# Altium footprint library Connectors THD.PcbLib: 631 footprints (part 38 of 46) (continued)
## SOURIAU_UT071619P21E8T [mm] "Metal Circular Connector, 19 Male Contacts, Shell Size 16, UT07 Series" (continued)
  text "19" at -7.866,5.19 h1.2
  text "5" at -5.429,-1.946 h1.2
  text "15" at -7.797,-6.635 h1.2
  text "10" at 5.554,5.891 h1.2
  text "1" at 0.522,2.079 h1.2
  text "B19M" at -1.964,13.841 h1.2
3D body: height 31.35, standoff -4.75, extent -19.05,-19.05 19.05,19.05

## SOURIAU_UT071619S21E84T [mm] "Metal Circular Connector, 19 Female Contacts, Shell Size 16, UT07 Series"
height 24.3
pads (19):
  round 1.9 hole 1.2: 1(0,0) 2(-2.75,2.8) 3(-3.8,-1) 4(-1,-3.8) 5(2.75,-2.8) 6(3.8,1) 7(1,3.8) 8(0,7.5) 9(-3.75,6.5) 10(-6.5,3.75) 11(-7.5,0) 12(-6.5,-3.75) 13(-3.75,-6.5) 14(0,-7.5) 15(3.75,-6.5) 16(6.5,-3.75) 17(7.5,0) 18(6.5,3.75) 19(3.75,6.5)
Top Overlay:
  circle w0.2: c0,0 r1.65
  circle w0.2: c2.75,-2.8 r1.65
  circle w0.2: c-6.5,3.75 r1.65
  circle w0.2: c3.75,-6.5 r1.65
  circle w0.2: c0,0 r12.65
  circle w0.2: c0,0 r16
  circle w0.2: c0,0 r18
  circle w0.2: c3.75,6.5 r1.65
  lines w0.2: -11.505,7.739 cw(c0,0) -4.585,13.085 4.585,13.085 cw(c0,0) 11.504,7.74 ; -11.397,5.489 -13.16,6.507 -12.215,8.143 -10.452,7.126 ; -7.077,-1.595 -6.927,-2.156 ; -7.077,1.595 -6.927,2.156 ; -5.333,-4.917 -4.917,-5.333 ; -5.333,4.917 -4.917,5.333 ; -3.361,0.59 -3.189,1.21 ; -2.633,-2.167 -2.167,-2.633 ; -2.156,-6.927 -1.609,-7.073 ; -2.156,6.925 -1.594,7.075 ; -1.594,1.623 -1.156,1.177 ; -0.945,-12.615 -0.945,-14.65 0.945,-14.65 0.945,-12.615 ; 0.43,5.907 0.57,5.393 ; 0.594,-3.375 1.156,-3.225 ; 0.952,-13.832 ccw(c0,0) 12.452,6.098 ; 1.58,-7.081 2.156,-6.927 ; 2.167,2.633 2.633,2.167 ; 3.189,-1.21 3.361,-0.59 ; 4.917,-5.333 5.333,-4.917 ; 4.917,5.333 5.333,4.917 ; 6.927,-2.156 7.077,-1.594 ; 6.927,2.156 7.077,1.594 ; 10.452,7.126 12.215,8.143 13.16,6.507 11.397,5.489 ; -19.05,-7.97 ccw(c0,0) -7.97,-19.05 7.97,-19.05 ccw(c0,0) 19.05,-7.97 19.05,7.97 ccw(c0,0) 7.97,19.05 -7.97,19.05 ccw(c0,0) -19.05,7.97 -19.05,-7.97 ; -16,-7.089 ccw(c0,0) -14.139,-10.312 -1.861,-17.401 ccw(c0,0) 1.861,-17.401 14.139,-10.312 ccw(c0,0) 16,-7.089 16,7.089 ccw(c0,0) 14.139,10.312 1.861,17.401 ccw(c0,0) -1.861,17.401 -14.139,10.312 ccw(c0,0) -16,7.089 -16,-7.089 ; -12.456,6.09 ccw(c0,0) -0.947,-13.833 cw(c0,0) -12.456,6.09 ; -11.442,-2.445 ccw(c0,0) -11.131,-3.604 -10.115,-3.332 ccw(c0,0) -7.294,-7.76 -7.97,-8.565 ccw(c0,0) -7.051,-9.337 -6.375,-8.531 ccw(c0,0) 5.607,-9.054 6.211,-9.916 ccw(c0,0) 7.194,-9.227 6.59,-8.366 ccw(c0,0) 10.54,-1.524 11.588,-1.616 ccw(c0,0) 11.692,-0.421 10.645,-0.329 ccw(c0,0) 1.4,10.558 1.4,11.616 ccw(c0,0) -1.4,11.616 -1.4,10.558 ccw(c0,0) -10.426,-2.172 -11.442,-2.445
  text "B19F" at -1.887,13.856 h1.2
  text "B19F" at -1.887,13.856 h1.2
  text "1" at -0.9,2.075 h1.2
  text "10" at -7.4,5.8 h1.2
  text "15" at 5.8,-6.75 h1.2
  text "5" at 4.625,-1.9 h1.2
  text "19" at 5.875,5.375 h1.2
Mechanical 8:
  circle w0.1: c1,3.8 r1.2
  circle w0.1: c-2.75,2.8 r1.2
  circle w0.1: c-3.8,-1 r1.2
  circle w0.1: c-1,-3.8 r1.2
  circle w0.1: c3.8,1 r1.2
  circle w0.1: c6.5,3.75 r1.2
  circle w0.1: c7.5,0 r1.2
  circle w0.1: c6.5,-3.75 r1.2
  circle w0.1: c0,-7.5 r1.2
  circle w0.1: c-3.75,-6.5 r1.2
  circle w0.1: c-6.5,-3.75 r1.2
  circle w0.1: c-7.5,0 r1.2
  circle w0.1: c-3.75,6.5 r1.2
  circle w0.1: c0,7.5 r1.2
  circle w0.1: c-6.5,3.75 r1.2
  circle w0.1: c3.75,6.5 r1.2
  circle w0.1: c3.75,-6.5 r1.2
  circle w0.1: c2.75,-2.8 r1.2
  circle w0.1: c0,0 r1.2
  lines w0.1: -8,0 -7.5,0 ; -7.5,-0.5 -7.5,0 ; -7.5,0.5 -7.5,0 ; -7,-3.75 -6.5,-3.75 ; -7,0 -7.5,0 ; -7,3.75 -6.5,3.75 ; -6.5,-4.25 -6.5,-3.75 ; -6.5,-3.25 -6.5,-3.75 ; -6.5,3.25 -6.5,3.75 ; -6.5,4.25 -6.5,3.75 ; -6,-3.75 -6.5,-3.75 ; -6,3.75 -6.5,3.75 ; -4.3,-1 -3.8,-1 ; -4.25,-6.5 -3.75,-6.5 ; -4.25,6.5 -3.75,6.5 ; -3.8,-1.5 -3.8,-1 ; -3.8,-0.5 -3.8,-1 ; -3.75,-7 -3.75,-6.5 ; -3.75,-6 -3.75,-6.5 ; -3.75,6 -3.75,6.5 ; -3.75,7 -3.75,6.5 ; -3.3,-1 -3.8,-1 ; -3.25,-6.5 -3.75,-6.5 ; -3.25,2.8 -2.75,2.8 ; -3.25,6.5 -3.75,6.5 ; -2.75,2.3 -2.75,2.8 ; -2.75,3.3 -2.75,2.8 ; -2.25,2.8 -2.75,2.8 ; -1.5,-3.8 -1,-3.8 ; -1,-4.3 -1,-3.8 ; -1,-3.3 -1,-3.8 ; -0.5,-7.5 0,-7.5 ; -0.5,-3.8 -1,-3.8 ; -0.5,0 0,0 ; -0.5,7.5 0,7.5 ; 0,-8 0,-7.5 ; 0,-7 0,-7.5 ; 0,-0.5 0,0 ; 0,0.5 0,0 ; 0,7 0,7.5 ; 0,8 0,7.5 ; 0.5,-7.5 0,-7.5 ; 0.5,0 0,0 ; 0.5,3.8 1,3.8 ; 0.5,7.5 0,7.5 ; 1,3.3 1,3.8 ; 1,4.3 1,3.8 ; 1.5,3.8 1,3.8 ; 2.25,-2.8 2.75,-2.8 ; 2.75,-3.3 2.75,-2.8 ; 2.75,-2.3 2.75,-2.8 ; 3.25,-6.5 3.75,-6.5 ; 3.25,-2.8 2.75,-2.8 ; 3.25,6.5 3.75,6.5 ; 3.3,1 3.8,1 ; 3.75,-7 3.75,-6.5 ; 3.75,-6 3.75,-6.5 ; 3.75,6 3.75,6.5 ; 3.75,7 3.75,6.5 ; 3.8,0.5 3.8,1 ; 3.8,1.5 3.8,1 ; 4.25,-6.5 3.75,-6.5 ; 4.25,6.5 3.75,6.5 ; 4.3,1 3.8,1 ; 6,-3.75 6.5,-3.75 ; 6,3.75 6.5,3.75 ; 6.5,-4.25 6.5,-3.75 ; 6.5,-3.25 6.5,-3.75 ; 6.5,3.25 6.5,3.75 ; 6.5,4.25 6.5,3.75 ; 7,-3.75 6.5,-3.75 ; 7,0 7.5,0 ; 7,3.75 6.5,3.75 ; 7.5,-0.5 7.5,0 ; 7.5,0.5 7.5,0 ; 8,0 7.5,0
Mechanical 14:
  circle w0.1: c3.75,6.5 r1.65
  circle w0.1: c0,0 r18
  circle w0.1: c0,0 r16
  circle w0.1: c0,0 r12.65
  circle w0.1: c3.75,-6.5 r1.65
  circle w0.1: c-6.5,3.75 r1.65
  circle w0.1: c2.75,-2.8 r1.65
  circle w0.1: c0,0 r1.65
  lines w0.1: -12.456,6.09 ccw(c0,0) -0.947,-13.833 ; -11.505,7.739 cw(c0,0) -4.585,13.085 4.585,13.085 cw(c0,0) 11.504,7.74 ; -11.397,5.489 -13.16,6.507 -12.215,8.143 -10.452,7.126 ; -7.077,-1.595 -6.927,-2.156 ; -7.077,1.595 -6.927,2.156 ; -5.333,-4.917 -4.917,-5.333 ; -5.333,4.917 -4.917,5.333 ; -3.361,0.59 -3.189,1.21 ; -2.633,-2.167 -2.167,-2.633 ; -2.156,-6.927 -1.609,-7.073 ; -2.156,6.925 -1.594,7.075 ; -1.594,1.623 -1.156,1.177 ; -0.945,-12.615 -0.945,-14.65 0.945,-14.65 0.945,-12.615 ; 0.43,5.907 0.57,5.393 ; 0.594,-3.375 1.156,-3.225 ; 0.952,-13.832 ccw(c0,0) 12.452,6.098 ; 1.58,-7.081 2.156,-6.927 ; 2.167,2.633 2.633,2.167 ; 3.189,-1.21 3.361,-0.59 ; 4.917,-5.333 5.333,-4.917 ; 4.917,5.333 5.333,4.917 ; 6.927,-2.156 7.077,-1.594 ; 6.927,2.156 7.077,1.594 ; 10.452,7.126 12.215,8.143 13.16,6.507 11.397,5.489 ; -19.05,-7.97 ccw(c0,0) -7.97,-19.05 7.97,-19.05 ccw(c0,0) 19.05,-7.97 19.05,7.97 ccw(c0,0) 7.97,19.05 -7.97,19.05 ccw(c0,0) -19.05,7.97 -19.05,-7.97 ; -16,-7.089 ccw(c0,0) -14.139,-10.312 -1.861,-17.401 ccw(c0,0) 1.861,-17.401 14.139,-10.312 ccw(c0,0) 16,-7.089 16,7.089 ccw(c0,0) 14.139,10.312 1.861,17.401 ccw(c0,0) -1.861,17.401 -14.139,10.312 ccw(c0,0) -16,7.089 -16,-7.089 ; -11.442,-2.445 ccw(c0,0) -11.131,-3.604 -10.115,-3.332 ccw(c0,0) -7.294,-7.76 -7.97,-8.565 ccw(c0,0) -7.051,-9.337 -6.375,-8.531 ccw(c0,0) 5.607,-9.054 6.211,-9.916 ccw(c0,0) 7.194,-9.227 6.59,-8.366 ccw(c0,0) 10.54,-1.524 11.588,-1.616 ccw(c0,0) 11.692,-0.421 10.645,-0.329 ccw(c0,0) 1.4,10.558 1.4,11.616 ccw(c0,0) -1.4,11.616 -1.4,10.558 ccw(c0,0) -10.426,-2.172 -11.442,-2.445
  text "19" at 5.875,5.375 h1.2
  text "5" at 4.625,-1.9 h1.2
  text "15" at 5.8,-6.75 h1.2
  text "10" at -7.4,5.8 h1.2
  text "1" at -0.9,2.075 h1.2
  text "B19F" at -1.887,13.856 h1.2
3D body: height 23.75, standoff -4.75, extent -19.05,-19.05 19.05,19.05

## SOURIAU_UT072028P21E8T [mm] "Metal Circular Connector, 28 Male Contacts, Shell Size 20, UT07 Series"
height 32.6
pads (28):
  round 1.9 hole 1.2: 1(-1.6,1.65) 2(2.2,0.6) 3(-0.6,-2.2) 4(-3.4,-4.9) 5(-5.75,-1.55) 6(-5.4,2.55) 7(-2.55,5.45) 8(1.55,5.8) 9(4.9,3.45) 10(6,-0.5) 11(4.25,-4.25) 12(0.5,-6) 13(-3.8,-9.25) 14(-7.05,-7.05) 15(-9.25,-3.8) 16(-10,0) 17(-9.25,3.8) 18(-7.05,7.05) 19(-3.8,9.25) 20(0,10) 21(3.8,9.25) 22(7.05,7.05) 23(9.25,3.8) 24(10,0) 25(9.25,-3.8) 26(7.05,-7.05) 27(3.8,-9.25) 28(0,-10)
Top Overlay:
  circle w0.2: c0,0 r22
  circle w0.2: c0,0 r20
  circle w0.2: c0,0 r15.85
  circle w0.2: c-1.6,1.65 r1.65
  circle w0.2: c-5.75,-1.55 r1.65
  circle w0.2: c6,-0.5 r1.65
  circle w0.2: c-9.25,-3.8 r1.65
  circle w0.2: c0,10 r1.65
  circle w0.2: c9.25,-3.8 r1.65
  lines w0.2: -14.739,7.418 ccw(c0,0) -0.945,-16.473 ; -14.175,7.092 -15.931,8.107 -14.986,9.743 -13.229,8.729 ; -13.793,9.055 cw(c0,0) 13.793,9.055 ; -9.681,-1.619 -9.57,-2.181 ; -9.681,1.619 -9.57,2.181 ; -8.325,-5.166 -7.975,-5.684 ; -8.325,5.166 -7.975,5.684 ; -5.684,-7.975 -5.166,-8.325 ; -5.684,7.975 -5.166,8.325 ; -5.61,0.094 -5.54,0.906 ; -4.802,-2.901 -4.348,-3.549 ; -4.243,3.727 -3.707,4.273 ; -2.484,-8.255 -0.816,-6.995 ; -2.212,-3.755 -1.788,-3.345 ; -2.181,9.57 -1.619,9.681 ; -0.945,-15.822 -0.945,-17.85 0.945,-17.85 0.945,-15.822 ; -0.906,5.59 -0.094,5.66 ; -0.01,1.211 0.61,1.039 ; 0.567,-1.033 1.033,-0.567 ; 0.945,-16.473 ccw(c0,0) 14.738,7.418 ; 1.619,-9.681 2.181,-9.57 ; 1.619,9.681 2.181,9.57 ; 1.995,-5.302 2.755,-4.948 ; 2.901,4.852 3.549,4.398 ; 4.948,-2.755 5.302,-1.995 ; 5.166,-8.325 5.684,-7.975 ; 5.166,8.325 5.684,7.975 ; 5.343,1.86 5.557,1.09 ; 7.451,-12.122 7.668,-12.433 ; 7.975,-5.684 8.325,-5.166 ; 7.975,5.684 8.325,5.166 ; 8.843,-11.147 9.061,-11.458 ; 9.57,-2.181 9.681,-1.619 ; 9.57,2.181 9.681,1.619 ; 13.229,8.729 14.986,9.743 15.931,8.107 14.175,7.093 ; -23.01,-8.701 ccw(c0,0) -8.701,-23.01 8.701,-23.01 ccw(c0,0) 23.01,-8.701 23.01,8.701 ccw(c0,0) 8.701,23.01 -8.701,23.01 ccw(c0,0) -23.01,8.701 -23.01,-8.701 ; -20,-7.89 ccw(c0,0) -16.833,-13.376 -3.167,-21.265 ccw(c0,0) 3.167,-21.265 16.833,-13.376 ccw(c0,0) 20,-7.89 20,7.89 ccw(c0,0) 16.833,13.376 3.167,21.265 ccw(c0,0) -3.167,21.265 -16.833,13.376 ccw(c0,0) -20,7.89 -20,-7.89 ; -14.444,-2.99 ccw(c-0.029,-0.008) -14.004,-4.632 -13.133,-4.399 ccw(c0,0) -9.537,-10.043 -10.116,-10.734 ccw(c-0.049,-0.061) -8.814,-11.827 -8.235,-11.136 ccw(c0,0) 7.233,-11.811 7.75,-12.55 ccw(c0,0) 9.142,-11.575 8.625,-10.836 ccw(c0,0) 13.697,-2.052 14.595,-2.13 ccw(c0,0) 14.744,-0.437 13.845,-0.358 ccw(c0,0) 1.65,13.751 1.65,14.657 ccw(c0,0) -1.65,14.657 -1.65,13.751 ccw(c0,0) -13.573,-2.757 -14.444,-2.99
  text "25" at 9.537,-7.356 h1.2
  text "1" at 0.302,2.828 h1.2
  text "10" at 6.687,1.424 h1.2
  text "5" at -3.288,-1.79 h1.2
  text "15" at -10.792,-7.424 h1.2
  text "20" at -0.811,12.345 h1.2
Mechanical 8:
  lines w0.1: -11,0 -10,0 ; -10.25,-3.8 -9.25,-3.8 ; -10.25,3.8 -9.25,3.8 ; -10,-1 -10,0 ; -10,1 -10,0 ; -9.25,-4.8 -9.25,-3.8 ; -9.25,-2.8 -9.25,-3.8 ; -9.25,2.8 -9.25,3.8 ; -9.25,4.8 -9.25,3.8 ; -9,0 -10,0 ; -8.25,-3.8 -9.25,-3.8 ; -8.25,3.8 -9.25,3.8 ; -8.05,-7.05 -7.05,-7.05 ; -8.05,7.05 -7.05,7.05 ; -7.05,-8.05 -7.05,-7.05 ; -7.05,-6.05 -7.05,-7.05 ; -7.05,6.05 -7.05,7.05 ; -7.05,8.05 -7.05,7.05 ; -6.75,-1.55 -5.75,-1.55 ; -6.4,2.55 -5.4,2.55 ; -6.05,-7.05 -7.05,-7.05 ; -6.05,7.05 -7.05,7.05 ; -5.75,-2.55 -5.75,-1.55 ; -5.75,-0.55 -5.75,-1.55 ; -5.4,1.55 -5.4,2.55 ; -5.4,3.55 -5.4,2.55 ; -4.8,-9.25 -3.8,-9.25 ; -4.8,9.25 -3.8,9.25 ; -4.75,-1.55 -5.75,-1.55 ; -4.4,-4.9 -3.4,-4.9 ; -4.4,2.55 -5.4,2.55 ; -3.8,-10.25 -3.8,-9.25 ; -3.8,-8.25 -3.8,-9.25 ; -3.8,8.25 -3.8,9.25 ; -3.8,10.25 -3.8,9.25 ; -3.55,5.45 -2.55,5.45 ; -3.4,-5.9 -3.4,-4.9 ; -3.4,-3.9 -3.4,-4.9 ; -2.8,-9.25 -3.8,-9.25 ; -2.8,9.25 -3.8,9.25 ; -2.6,1.65 -1.6,1.65 ; -2.55,4.45 -2.55,5.45 ; -2.55,6.45 -2.55,5.45 ; -2.4,-4.9 -3.4,-4.9 ; -1.6,-2.2 -0.6,-2.2 ; -1.6,0.65 -1.6,1.65 ; -1.6,2.65 -1.6,1.65 ; -1.55,5.45 -2.55,5.45 ; -1,-10 0,-10 ; -1,10 0,10 ; -0.6,-3.2 -0.6,-2.2 ; -0.6,-1.2 -0.6,-2.2 ; -0.6,1.65 -1.6,1.65 ; -0.5,-6 0.5,-6 ; -0.5,0 0,0 ; 0,-11 0,-10 ; 0,-9 0,-10 ; 0,-0.5 0,0 ; 0,0.5 0,0 ; 0,9 0,10 ; 0,11 0,10 ; 0.4,-2.2 -0.6,-2.2 ; 0.5,-7 0.5,-6 ; 0.5,-5 0.5,-6 ; 0.5,0 0,0 ; 0.55,5.8 1.55,5.8 ; 1,-10 0,-10 ; 1,10 0,10 ; 1.2,0.6 2.2,0.6 ; 1.5,-6 0.5,-6 ; 1.55,4.8 1.55,5.8 ; 1.55,6.8 1.55,5.8 ; 2.2,-0.4 2.2,0.6 ; 2.2,1.6 2.2,0.6 ; 2.55,5.8 1.55,5.8 ; 2.8,-9.25 3.8,-9.25 ; 2.8,9.25 3.8,9.25 ; 3.2,0.6 2.2,0.6 ; 3.25,-4.25 4.25,-4.25 ; 3.8,-10.25 3.8,-9.25 ; 3.8,-8.25 3.8,-9.25 ; 3.8,8.25 3.8,9.25 ; 3.8,10.25 3.8,9.25 ; 3.9,3.45 4.9,3.45 ; 4.25,-5.25 4.25,-4.25 ; 4.25,-3.25 4.25,-4.25 ; 4.8,-9.25 3.8,-9.25 ; 4.8,9.25 3.8,9.25 ; 4.9,2.45 4.9,3.45 ; 4.9,4.45 4.9,3.45 ; 5,-0.5 6,-0.5 ; 5.25,-4.25 4.25,-4.25 ; 5.9,3.45 4.9,3.45 ; 6,-1.5 6,-0.5 ; 6,0.5 6,-0.5 ; 6.05,-7.05 7.05,-7.05 ; 6.05,7.05 7.05,7.05 ; 7,-0.5 6,-0.5 ; 7.05,-8.05 7.05,-7.05 ; 7.05,-6.05 7.05,-7.05 ; 7.05,6.05 7.05,7.05 ; 7.05,8.05 7.05,7.05 ; 8.05,-7.05 7.05,-7.05 ; 8.05,7.05 7.05,7.05 ; 8.25,-3.8 9.25,-3.8 ; 8.25,3.8 9.25,3.8 ; 9,0 10,0 ; 9.25,-4.8 9.25,-3.8 ; 9.25,-2.8 9.25,-3.8 ; 9.25,2.8 9.25,3.8 ; 9.25,4.8 9.25,3.8 ; 10,-1 10,0 ; 10,1 10,0 ; 10.25,-3.8 9.25,-3.8 ; 10.25,3.8 9.25,3.8 ; 11,0 10,0
Mechanical 14:
  circle w0.1: c0,0 r22
  circle w0.1: c0,0 r20
  circle w0.1: c0,0 r15.85
  circle w0.1: c-1.6,1.65 r1.65
  circle w0.1: c-5.75,-1.55 r1.65
  circle w0.1: c6,-0.5 r1.65
  circle w0.1: c-9.25,-3.8 r1.65
  circle w0.1: c0,10 r1.65
  circle w0.1: c9.25,-3.8 r1.65
  circle w0.1: c10,0 r0.8
  circle w0.1: c9.25,3.8 r0.8
  circle w0.1: c7.05,7.05 r0.8
  circle w0.1: c3.8,9.25 r0.8
  circle w0.1: c-3.8,9.25 r0.8
  circle w0.1: c-7.05,7.05 r0.8
  circle w0.1: c-9.25,3.8 r0.8
  circle w0.1: c-10,0 r0.8
  circle w0.1: c-7.05,-7.05 r0.8
  circle w0.1: c-3.8,-9.25 r0.8
  circle w0.1: c0.5,-6 r0.8
  circle w0.1: c-3.4,-4.9 r0.8
  circle w0.1: c-5.4,2.55 r0.8
  circle w0.1: c-2.55,5.45 r0.8
  circle w0.1: c1.55,5.8 r0.8
  circle w0.1: c4.9,3.45 r0.8
  circle w0.1: c2.2,0.6 r0.8
  circle w0.1: c-0.6,-2.2 r0.8
  circle w0.1: c4.25,-4.25 r0.8
  circle w0.1: c7.05,-7.05 r0.8
  circle w0.1: c3.8,-9.25 r0.8
  circle w0.1: c0,-10 r0.8
  lines w0.1: -14.739,7.418 ccw(c0,0) -0.945,-16.473 ; -14.175,7.092 -15.931,8.107 -14.986,9.743 -13.229,8.729 ; -13.793,9.055 cw(c0,0) 13.793,9.055 ; -9.681,-1.619 -9.57,-2.181 ; -9.681,1.619 -9.57,2.181 ; -8.325,-5.166 -7.975,-5.684 ; -8.325,5.166 -7.975,5.684 ; -5.684,-7.975 -5.166,-8.325 ; -5.684,7.975 -5.166,8.325 ; -5.61,0.094 -5.54,0.906 ; -4.802,-2.901 -4.348,-3.549 ; -4.243,3.727 -3.707,4.273 ; -2.484,-8.255 -0.816,-6.995 ; -2.212,-3.755 -1.788,-3.345 ; -2.181,9.57 -1.619,9.681 ; -0.945,-15.822 -0.945,-17.85 0.945,-17.85 0.945,-15.822 ; -0.906,5.59 -0.094,5.66 ; -0.01,1.211 0.61,1.039 ; 0.567,-1.033 1.033,-0.567 ; 0.945,-16.473 ccw(c0,0) 14.738,7.418 ; 1.619,-9.681 2.181,-9.57 ; 1.619,9.681 2.181,9.57 ; 1.995,-5.302 2.755,-4.948 ; 2.901,4.852 3.549,4.398 ; 4.948,-2.755 5.302,-1.995 ; 5.166,-8.325 5.684,-7.975 ; 5.166,8.325 5.684,7.975 ; 5.343,1.86 5.557,1.09 ; 7.451,-12.122 7.668,-12.433 ; 7.975,-5.684 8.325,-5.166 ; 7.975,5.684 8.325,5.166 ; 8.843,-11.147 9.061,-11.458 ; 9.57,-2.181 9.681,-1.619 ; 9.57,2.181 9.681,1.619 ; 13.229,8.729 14.986,9.743 15.931,8.107 14.175,7.093 ; -23.01,-8.701 ccw(c0,0) -8.701,-23.01 8.701,-23.01 ccw(c0,0) 23.01,-8.701 23.01,8.701 ccw(c0,0) 8.701,23.01 -8.701,23.01 ccw(c0,0) -23.01,8.701 -23.01,-8.701 ; -20,-7.89 ccw(c0,0) -16.833,-13.376 -3.167,-21.265 ccw(c0,0) 3.167,-21.265 16.833,-13.376 ccw(c0,0) 20,-7.89 20,7.89 ccw(c0,0) 16.833,13.376 3.167,21.265 ccw(c0,0) -3.167,21.265 -16.833,13.376 ccw(c0,0) -20,7.89 -20,-7.89 ; -14.444,-2.99 ccw(c-0.029,-0.008) -14.004,-4.632 -13.133,-4.399 ccw(c0,0) -9.537,-10.043 -10.116,-10.734 ccw(c-0.049,-0.061) -8.814,-11.827 -8.235,-11.136 ccw(c0,0) 7.233,-11.811 7.75,-12.55 ccw(c0,0) 9.142,-11.575 8.625,-10.836 ccw(c0,0) 13.697,-2.052 14.595,-2.13 ccw(c0,0) 14.744,-0.437 13.845,-0.358 ccw(c0,0) 1.65,13.751 1.65,14.657 ccw(c0,0) -1.65,14.657 -1.65,13.751 ccw(c0,0) -13.573,-2.757 -14.444,-2.99
  text "25" at 9.537,-7.356 h1.2
  text "1" at 0.302,2.828 h1.2
  text "10" at 6.687,1.424 h1.2
  text "5" at -3.288,-1.79 h1.2
  text "15" at -10.792,-7.424 h1.2
  text "20" at -0.811,12.345 h1.2
3D body: height 32.65, standoff -4.75, extent -23.01,-23.01 23.01,23.01

## SOURIAU_UT072028S21E86T [mm] "Metal Circular Connector, 28 Female Contacts, Shell Size 20, UT07 Series"
height 26.5
pads (28):
  round 1.9 hole 1.2: 1(1.6,1.65) 2(-2.2,0.6) 3(0.6,-2.2) 4(3.4,-4.9) 5(5.75,-1.55) 6(5.4,2.55) 7(2.55,5.45) 8(-1.55,5.8) 9(-4.9,3.45) 10(-6,-0.5) 11(-4.25,-4.25) 12(-0.5,-6) 13(3.8,-9.25) 14(7.05,-7.05) 15(9.25,-3.8) 16(10,0) 17(9.25,3.8) 18(7.05,7.05) 19(3.8,9.25) 20(0,10) 21(-3.8,9.25) 22(-7.05,7.05) 23(-9.25,3.8) 24(-10,0) 25(-9.25,-3.8) 26(-7.05,-7.05) 27(-3.8,-9.25) 28(0,-10)
Top Overlay:
  circle w0.2: c-9.25,-3.8 r1.65
  circle w0.2: c1.6,1.65 r1.65
  circle w0.2: c5.75,-1.55 r1.65
  circle w0.2: c-6,-0.5 r1.65
  circle w0.2: c9.25,-3.8 r1.65
  circle w0.2: c0,-10 r1.65
  circle w0.2: c0,10 r1.65
  circle w0.2: c0,0 r15.85
  circle w0.2: c0,0 r20
  circle w0.2: c0,0 r22
  lines w0.2: -14.739,7.418 ccw(c0,0) -0.945,-16.473 ; -14.175,7.092 -15.931,8.107 -14.986,9.743 -13.229,8.729 ; -13.793,9.055 cw(c0,0) 13.793,9.055 ; -9.681,-1.619 -9.57,-2.181 ; -9.681,1.619 -9.57,2.181 ; -8.325,-5.166 -7.975,-5.684 ; -8.325,5.166 -7.975,5.684 ; -5.684,-7.975 -5.166,-8.325 ; -5.684,7.975 -5.166,8.325 ; -5.557,1.09 -5.343,1.86 ; -5.302,-1.995 -4.948,-2.755 ; -3.549,4.398 -2.901,4.852 ; -2.755,-4.948 -1.995,-5.302 ; -2.181,-9.57 -1.619,-9.681 ; -2.181,9.57 -1.619,9.681 ; -1.033,-0.567 -0.567,-1.033 ; -0.945,-15.822 -0.945,-17.85 0.945,-17.85 0.945,-15.822 ; -0.61,1.039 0.01,1.211 ; 0.094,5.66 0.906,5.59 ; 0.816,-6.995 2.484,-8.255 ; 0.945,-16.473 ccw(c0,0) 14.738,7.418 ; 1.619,9.681 2.181,9.57 ; 1.788,-3.345 2.212,-3.755 ; 3.707,4.273 4.243,3.727 ; 4.348,-3.549 4.802,-2.901 ; 5.166,-8.325 5.684,-7.975 ; 5.166,8.325 5.684,7.975 ; 5.54,0.906 5.61,0.094 ; 7.451,-12.122 7.668,-12.433 ; 7.975,-5.684 8.325,-5.166 ; 7.975,5.684 8.325,5.166 ; 8.843,-11.147 9.061,-11.458 ; 9.57,-2.181 9.681,-1.619 ; 9.57,2.181 9.681,1.619 ; 13.229,8.729 14.986,9.743 15.931,8.107 14.175,7.093 ; -23.01,-8.701 ccw(c0,0) -8.701,-23.01 8.701,-23.01 ccw(c0,0) 23.01,-8.701 23.01,8.701 ccw(c0,0) 8.701,23.01 -8.701,23.01 ccw(c0,0) -23.01,8.701 -23.01,-8.701 ; -20,-7.89 ccw(c0,0) -16.833,-13.376 -3.167,-21.265 ccw(c0,0) 3.167,-21.265 16.833,-13.376 ccw(c0,0) 20,-7.89 20,7.89 ccw(c0,0) 16.833,13.376 3.167,21.265 ccw(c0,0) -3.167,21.265 -16.833,13.376 ccw(c0,0) -20,7.89 -20,-7.89 ; -14.444,-2.99 ccw(c-0.029,-0.008) -14.004,-4.632 -13.133,-4.399 ccw(c0,0) -9.537,-10.043 -10.116,-10.734 ccw(c-0.049,-0.061) -8.814,-11.827 -8.235,-11.136 ccw(c0,0) 7.233,-11.811 7.75,-12.55 ccw(c0,0) 9.142,-11.575 8.625,-10.836 ccw(c0,0) 13.697,-2.052 14.595,-2.13 ccw(c0,0) 14.744,-0.437 13.845,-0.358 ccw(c0,0) 1.65,13.751 1.65,14.657 ccw(c0,0) -1.65,14.657 -1.65,13.751 ccw(c0,0) -13.573,-2.757 -14.444,-2.99
  text "B28M" at -1.812,17.681 h1.2
  text "B28M" at -1.812,17.681 h1.2
  text "25" at -10.869,-7.459 h1.2
  text "28" at 2.031,-12.509 h1.2
  text "20" at -1.068,12.299 h1.2
  text "15" at 9.032,-7.385 h1.2
  text "10" at -3.774,-2.757 h1.2
  text "5" at 5.404,-5.087 h1.2
  text "1" at 2.418,-1.887 h1.2
Mechanical 8:
  lines w0.1: -11,0 -10,0 ; -10.25,-3.8 -9.25,-3.8 ; -10.25,3.8 -9.25,3.8 ; -10,-1 -10,0 ; -10,1 -10,0 ; -9.25,-4.8 -9.25,-3.8 ; -9.25,-2.8 -9.25,-3.8 ; -9.25,2.8 -9.25,3.8 ; -9.25,4.8 -9.25,3.8 ; -9,0 -10,0 ; -8.25,-3.8 -9.25,-3.8 ; -8.25,3.8 -9.25,3.8 ; -8.05,-7.05 -7.05,-7.05 ; -8.05,7.05 -7.05,7.05 ; -7.05,-8.05 -7.05,-7.05 ; -7.05,-6.05 -7.05,-7.05 ; -7.05,6.05 -7.05,7.05 ; -7.05,8.05 -7.05,7.05 ; -7,-0.5 -6,-0.5 ; -6.05,-7.05 -7.05,-7.05 ; -6.05,7.05 -7.05,7.05 ; -6,-1.5 -6,-0.5 ; -6,0.5 -6,-0.5 ; -5.9,3.45 -4.9,3.45 ; -5.25,-4.25 -4.25,-4.25 ; -5,-0.5 -6,-0.5 ; -4.9,2.45 -4.9,3.45 ; -4.9,4.45 -4.9,3.45 ; -4.8,-9.25 -3.8,-9.25 ; -4.8,9.25 -3.8,9.25 ; -4.25,-5.25 -4.25,-4.25 ; -4.25,-3.25 -4.25,-4.25 ; -3.9,3.45 -4.9,3.45 ; -3.8,-10.25 -3.8,-9.25 ; -3.8,-8.25 -3.8,-9.25 ; -3.8,8.25 -3.8,9.25 ; -3.8,10.25 -3.8,9.25 ; -3.25,-4.25 -4.25,-4.25 ; -3.2,0.6 -2.2,0.6 ; -2.8,-9.25 -3.8,-9.25 ; -2.8,9.25 -3.8,9.25 ; -2.55,5.8 -1.55,5.8 ; -2.2,-0.4 -2.2,0.6 ; -2.2,1.6 -2.2,0.6 ; -1.55,4.8 -1.55,5.8 ; -1.55,6.8 -1.55,5.8 ; -1.5,-6 -0.5,-6 ; -1.2,0.6 -2.2,0.6 ; -1,-10 0,-10 ; -1,10 0,10 ; -0.55,5.8 -1.55,5.8 ; -0.5,-7 -0.5,-6 ; -0.5,-5 -0.5,-6 ; -0.5,0 0,0 ; -0.4,-2.2 0.6,-2.2 ; 0,-11 0,-10 ; 0,-9 0,-10 ; 0,-0.5 0,0 ; 0,0.5 0,0 ; 0,9 0,10 ; 0,11 0,10 ; 0.5,-6 -0.5,-6 ; 0.5,0 0,0 ; 0.6,-3.2 0.6,-2.2 ; 0.6,-1.2 0.6,-2.2 ; 0.6,1.65 1.6,1.65 ; 1,-10 0,-10 ; 1,10 0,10 ; 1.55,5.45 2.55,5.45 ; 1.6,-2.2 0.6,-2.2 ; 1.6,0.65 1.6,1.65 ; 1.6,2.65 1.6,1.65 ; 2.4,-4.9 3.4,-4.9 ; 2.55,4.45 2.55,5.45 ; 2.55,6.45 2.55,5.45 ; 2.6,1.65 1.6,1.65 ; 2.8,-9.25 3.8,-9.25 ; 2.8,9.25 3.8,9.25 ; 3.4,-5.9 3.4,-4.9 ; 3.4,-3.9 3.4,-4.9 ; 3.55,5.45 2.55,5.45 ; 3.8,-10.25 3.8,-9.25 ; 3.8,-8.25 3.8,-9.25 ; 3.8,8.25 3.8,9.25 ; 3.8,10.25 3.8,9.25 ; 4.4,-4.9 3.4,-4.9 ; 4.4,2.55 5.4,2.55 ; 4.75,-1.55 5.75,-1.55 ; 4.8,-9.25 3.8,-9.25 ; 4.8,9.25 3.8,9.25 ; 5.4,1.55 5.4,2.55 ; 5.4,3.55 5.4,2.55 ; 5.75,-2.55 5.75,-1.55 ; 5.75,-0.55 5.75,-1.55 ; 6.05,-7.05 7.05,-7.05 ; 6.05,7.05 7.05,7.05 ; 6.4,2.55 5.4,2.55 ; 6.75,-1.55 5.75,-1.55 ; 7.05,-8.05 7.05,-7.05 ; 7.05,-6.05 7.05,-7.05 ; 7.05,6.05 7.05,7.05 ; 7.05,8.05 7.05,7.05 ; 8.05,-7.05 7.05,-7.05 ; 8.05,7.05 7.05,7.05 ; 8.25,-3.8 9.25,-3.8 ; 8.25,3.8 9.25,3.8 ; 9,0 10,0 ; 9.25,-4.8 9.25,-3.8 ; 9.25,-2.8 9.25,-3.8 ; 9.25,2.8 9.25,3.8 ; 9.25,4.8 9.25,3.8 ; 10,-1 10,0 ; 10,1 10,0 ; 10.25,-3.8 9.25,-3.8 ; 10.25,3.8 9.25,3.8 ; 11,0 10,0
Mechanical 14:
  circle w0.1: c-9.25,-3.8 r1.65
  circle w0.1: c1.6,1.65 r1.65
  circle w0.1: c5.75,-1.55 r1.65
  circle w0.1: c-6,-0.5 r1.65
  circle w0.1: c9.25,-3.8 r1.65
  circle w0.1: c0,-10 r1.65
  circle w0.1: c0,10 r1.65
  circle w0.1: c0,0 r15.85
  circle w0.1: c0,0 r20
  circle w0.1: c0,0 r22
  lines w0.1: -14.739,7.418 ccw(c0,0) -0.945,-16.473 ; -14.175,7.092 -15.931,8.107 -14.986,9.743 -13.229,8.729 ; -13.793,9.055 cw(c0,0) 13.793,9.055 ; -9.681,-1.619 -9.57,-2.181 ; -9.681,1.619 -9.57,2.181 ; -8.325,-5.166 -7.975,-5.684 ; -8.325,5.166 -7.975,5.684 ; -5.684,-7.975 -5.166,-8.325 ; -5.684,7.975 -5.166,8.325 ; -5.557,1.09 -5.343,1.86 ; -5.302,-1.995 -4.948,-2.755 ; -3.549,4.398 -2.901,4.852 ; -2.755,-4.948 -1.995,-5.302 ; -2.181,-9.57 -1.619,-9.681 ; -2.181,9.57 -1.619,9.681 ; -1.033,-0.567 -0.567,-1.033 ; -0.945,-15.822 -0.945,-17.85 0.945,-17.85 0.945,-15.822 ; -0.61,1.039 0.01,1.211 ; 0.094,5.66 0.906,5.59 ; 0.816,-6.995 2.484,-8.255 ; 0.945,-16.473 ccw(c0,0) 14.738,7.418 ; 1.619,9.681 2.181,9.57 ; 1.788,-3.345 2.212,-3.755 ; 3.707,4.273 4.243,3.727 ; 4.348,-3.549 4.802,-2.901 ; 5.166,-8.325 5.684,-7.975 ; 5.166,8.325 5.684,7.975 ; 5.54,0.906 5.61,0.094 ; 7.451,-12.122 7.668,-12.433 ; 7.975,-5.684 8.325,-5.166 ; 7.975,5.684 8.325,5.166 ; 8.843,-11.147 9.061,-11.458 ; 9.57,-2.181 9.681,-1.619 ; 9.57,2.181 9.681,1.619 ; 13.229,8.729 14.986,9.743 15.931,8.107 14.175,7.093 ; -23.01,-8.701 ccw(c0,0) -8.701,-23.01 8.701,-23.01 ccw(c0,0) 23.01,-8.701 23.01,8.701 ccw(c0,0) 8.701,23.01 -8.701,23.01 ccw(c0,0) -23.01,8.701 -23.01,-8.701 ; -20,-7.89 ccw(c0,0) -16.833,-13.376 -3.167,-21.265 ccw(c0,0) 3.167,-21.265 16.833,-13.376 ccw(c0,0) 20,-7.89 20,7.89 ccw(c0,0) 16.833,13.376 3.167,21.265 ccw(c0,0) -3.167,21.265 -16.833,13.376 ccw(c0,0) -20,7.89 -20,-7.89 ; -14.444,-2.99 ccw(c-0.029,-0.008) -14.004,-4.632 -13.133,-4.399 ccw(c0,0) -9.537,-10.043 -10.116,-10.734 ccw(c-0.049,-0.061) -8.814,-11.827 -8.235,-11.136 ccw(c0,0) 7.233,-11.811 7.75,-12.55 ccw(c0,0) 9.142,-11.575 8.625,-10.836 ccw(c0,0) 13.697,-2.052 14.595,-2.13 ccw(c0,0) 14.744,-0.437 13.845,-0.358 ccw(c0,0) 1.65,13.751 1.65,14.657 ccw(c0,0) -1.65,14.657 -1.65,13.751 ccw(c0,0) -13.573,-2.757 -14.444,-2.99
  text "B28M" at -1.812,17.681 h1.2
  text "25" at -10.869,-7.459 h1.2
  text "28" at 2.031,-12.509 h1.2
  text "20" at -1.068,12.299 h1.2
  text "15" at 9.032,-7.385 h1.2
  text "10" at -3.774,-2.757 h1.2
  text "5" at 5.404,-5.087 h1.2
  text "1" at 2.418,-1.887 h1.2
3D body: height 26.5, standoff -15.6, extent -23.01,-23.01 23.01,23.01

## STOCKO_F/RM-0120 [mm] "6.35mm x 0.8mm PCB Horizontal Terminal Tab"
height 2.8
pads (2):
  round 2.3 hole 1.6: 1(-1.905,1.27) 1(1.905,-1.27)
Top Overlay:
  circle w0.2: c-12.605,0 r0.825
  lines w0.2: -15.805,-3.15 -16.605,-2.35 -16.605,2.35 -15.805,3.15 ; -15.805,-3.15 -8.605,-3.15 -8.605,-4 4.595,-4 4.595,4 -8.605,4 -8.605,3.15 -15.805,3.15 ; -15.805,-3.15 -15.805,3.15
Mechanical 8:
  lines w0.1: -2.405,1.27 -1.905,1.27 ; -1.905,0.77 -1.905,1.27 ; -1.905,1.77 -1.905,1.27 ; -1.405,1.27 -1.905,1.27 ; -0.5,0 0,0 ; 0,-0.5 0,0 ; 0,0.5 0,0 ; 0.5,0 0,0 ; 1.405,-1.27 1.905,-1.27 ; 1.905,-1.77 1.905,-1.27 ; 1.905,-0.77 1.905,-1.27 ; 2.405,-1.27 1.905,-1.27
Mechanical 14:
  circle w0.1: c-12.605,0 r0.825
  lines w0.1: -3.405,-4 -3.405,4 ; -15.805,-3.15 -8.605,-3.15 -8.605,-4 4.595,-4 4.595,4 -8.605,4 -8.605,3.15 -15.805,3.15 ; -15.805,-3.15 -16.605,-2.35 -16.605,2.35 -15.805,3.15 ; -15.805,-3.15 -15.805,3.15 ; -2.144,0 -2.144,0.87 -1.505,0.87 -1.505,1.67 0.705,1.67 1.905,0 2.305,0 2.305,-0.87 1.505,-0.87 1.505,-1.67 -0.705,-1.67 -1.905,0 -2.144,0
3D body: height 2.8, standoff -3.7, extent -16.605,-4 4.595,4